# Altium footprint library ICs And Semiconductors THD.PcbLib: 507 footprints (part 16 of 32)
Each footprint in its own frame and in the unit in brackets; x right, y up, seen from the top. Pads: shape width x height; smd on the part's side, far side on the other; paste and mask are expansions set on the pad; w line width, h text height; cw(c..) or ccw(c..) is an arc to the next point about the centre after c.
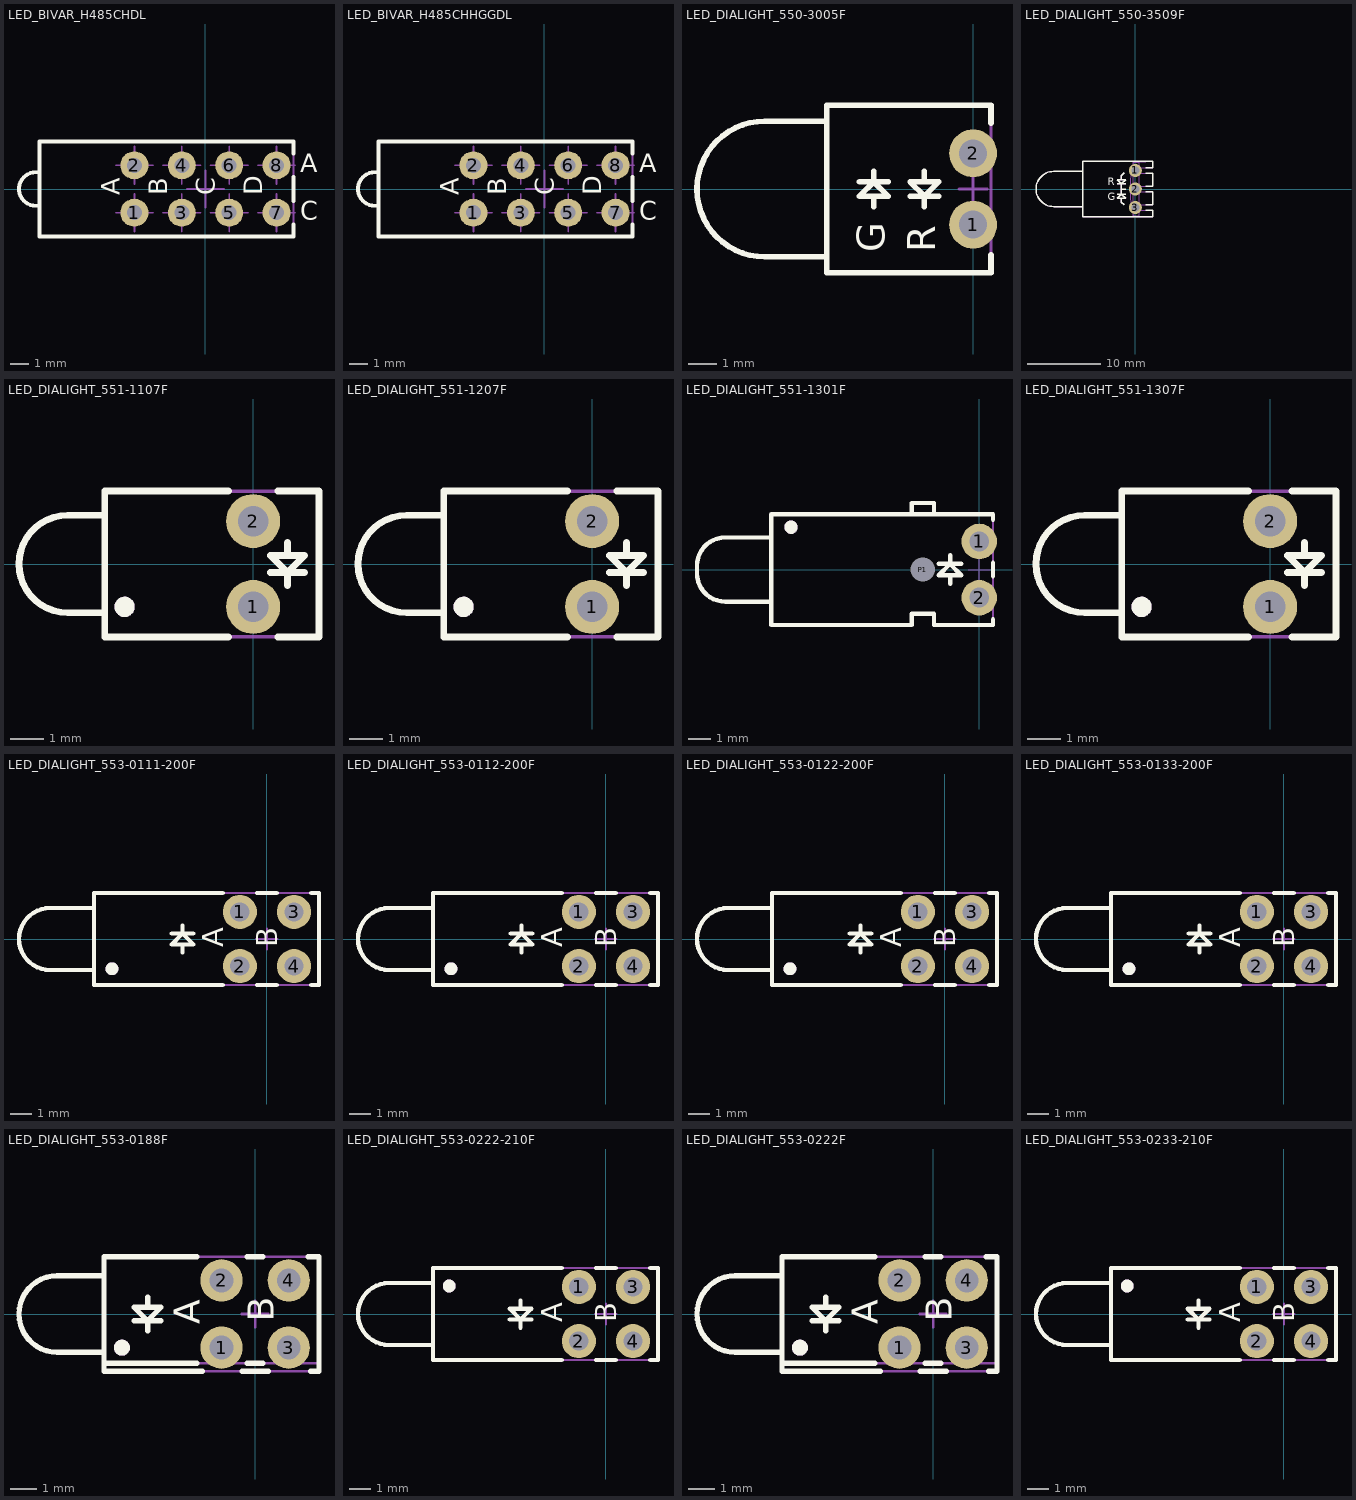
[diagram p15: the footprints below, top view; thin cyan lines are the x and y axes]

## LED_BIVAR_H485CHDL [mm] "Quad-Level 2mm HE Red, PCB Edge Mounting  BIVAR H485CHDL"
height 11.3
pads (8):
  round 1.5 hole 0.8: 1(-3.81,-1.27) 2(-3.81,1.27) 3(-1.27,-1.27) 4(-1.27,1.27) 5(1.27,-1.27) 6(1.27,1.27) 7(3.81,-1.27) 8(3.81,1.27)
Top Overlay:
  lines w0.2: -8.89,-0.9 -9.09,-0.9 cw(c-9.09,0) -9.09,0.9 -8.89,0.9 ; 4.71,-1.902 4.71,-2.55 -8.89,-2.55 -8.89,2.55 4.71,2.55 4.71,1.902 ; 4.71,-0.638 4.71,0.638
  text "A" at -4.591,-0.331 h1
  text "B" at -2.051,-0.331 h1
  text "C" at 0.489,-0.331 h1
  text "D" at 3.029,-0.331 h1
  text "A" at 5.08,0.889 h1
  text "C" at 5.08,-1.651 h1
Notvisible:
  lines w0.1: -4.81,-1.27 -3.81,-1.27 ; -4.81,1.27 -3.81,1.27 ; -3.81,-2.27 -3.81,-1.27 ; -3.81,-0.27 -3.81,-1.27 ; -3.81,0.27 -3.81,1.27 ; -3.81,2.27 -3.81,1.27 ; -2.81,-1.27 -3.81,-1.27 ; -2.81,1.27 -3.81,1.27 ; -2.27,-1.27 -1.27,-1.27 ; -2.27,1.27 -1.27,1.27 ; -1.27,-2.27 -1.27,-1.27 ; -1.27,-0.27 -1.27,-1.27 ; -1.27,0.27 -1.27,1.27 ; -1.27,2.27 -1.27,1.27 ; -1,0 0,0 ; -0.27,-1.27 -1.27,-1.27 ; -0.27,1.27 -1.27,1.27 ; 0,-1 0,0 ; 0,1 0,0 ; 0.27,-1.27 1.27,-1.27 ; 0.27,1.27 1.27,1.27 ; 1,0 0,0 ; 1.27,-2.27 1.27,-1.27 ; 1.27,-0.27 1.27,-1.27 ; 1.27,0.27 1.27,1.27 ; 1.27,2.27 1.27,1.27 ; 2.27,-1.27 1.27,-1.27 ; 2.27,1.27 1.27,1.27 ; 2.81,-1.27 3.81,-1.27 ; 2.81,1.27 3.81,1.27 ; 3.81,-2.27 3.81,-1.27 ; 3.81,-0.27 3.81,-1.27 ; 3.81,0.27 3.81,1.27 ; 3.81,2.27 3.81,1.27 ; 4.81,-1.27 3.81,-1.27 ; 4.81,1.27 3.81,1.27
Mechanical 14:
  lines w0.1: -8.89,-0.9 -9.09,-0.9 cw(c-9.09,0) -9.09,0.9 -8.89,0.9 ; -8.89,-2.55 -8.89,2.55 4.71,2.55 4.71,-2.55 -8.89,-2.55
  text "A" at -4.591,-0.331 h1
  text "B" at -2.051,-0.331 h1
  text "C" at 0.489,-0.331 h1
  text "D" at 3.029,-0.331 h1
  text "C" at 5.08,-1.651 h1
  text "A" at 5.08,0.889 h1
3D body "LED_BIVAR_H485CHDL.stp": height 11.3, standoff -3.2, extent -9.99,-2.55 4.71,2.55

## LED_BIVAR_H485CHHGGDL [mm] "Quad-Level 2mm (Green+Green+HeRed+HeRed) LED, PCB Edge Mounting BIVAR H485C Serie"
height 11.3
pads (8):
  round 1.5 hole 0.8: 1(-3.81,-1.27) 2(-3.81,1.27) 3(-1.27,-1.27) 4(-1.27,1.27) 5(1.27,-1.27) 6(1.27,1.27) 7(3.81,-1.27) 8(3.81,1.27)
Top Overlay:
  lines w0.2: -8.89,-0.9 -9.09,-0.9 cw(c-9.09,0) -9.09,0.9 -8.89,0.9 ; 4.71,-1.902 4.71,-2.55 -8.89,-2.55 -8.89,2.55 4.71,2.55 4.71,1.902 ; 4.71,-0.638 4.71,0.638
  text "C" at 5.08,-1.651 h1
  text "A" at 5.08,0.889 h1
  text "D" at 3.029,-0.331 h1
  text "C" at 0.489,-0.331 h1
  text "B" at -2.051,-0.331 h1
  text "A" at -4.591,-0.331 h1
Notvisible:
  lines w0.1: -4.81,-1.27 -3.81,-1.27 ; -4.81,1.27 -3.81,1.27 ; -3.81,-2.27 -3.81,-1.27 ; -3.81,-0.27 -3.81,-1.27 ; -3.81,0.27 -3.81,1.27 ; -3.81,2.27 -3.81,1.27 ; -2.81,-1.27 -3.81,-1.27 ; -2.81,1.27 -3.81,1.27 ; -2.27,-1.27 -1.27,-1.27 ; -2.27,1.27 -1.27,1.27 ; -1.27,-2.27 -1.27,-1.27 ; -1.27,-0.27 -1.27,-1.27 ; -1.27,0.27 -1.27,1.27 ; -1.27,2.27 -1.27,1.27 ; -1,0 0,0 ; -0.27,-1.27 -1.27,-1.27 ; -0.27,1.27 -1.27,1.27 ; 0,-1 0,0 ; 0,1 0,0 ; 0.27,-1.27 1.27,-1.27 ; 0.27,1.27 1.27,1.27 ; 1,0 0,0 ; 1.27,-2.27 1.27,-1.27 ; 1.27,-0.27 1.27,-1.27 ; 1.27,0.27 1.27,1.27 ; 1.27,2.27 1.27,1.27 ; 2.27,-1.27 1.27,-1.27 ; 2.27,1.27 1.27,1.27 ; 2.81,-1.27 3.81,-1.27 ; 2.81,1.27 3.81,1.27 ; 3.81,-2.27 3.81,-1.27 ; 3.81,-0.27 3.81,-1.27 ; 3.81,0.27 3.81,1.27 ; 3.81,2.27 3.81,1.27 ; 4.81,-1.27 3.81,-1.27 ; 4.81,1.27 3.81,1.27
Mechanical 14:
  lines w0.1: -8.89,-0.9 -9.09,-0.9 cw(c-9.09,0) -9.09,0.9 -8.89,0.9 ; -8.89,-2.55 4.71,-2.55 4.71,2.55 -8.89,2.55 -8.89,-2.55
  text "A" at 5.08,0.889 h1
  text "C" at 5.08,-1.651 h1
  text "D" at 3.029,-0.331 h1
  text "C" at 0.489,-0.331 h1
  text "B" at -2.051,-0.331 h1
  text "A" at -4.591,-0.331 h1
3D body "LED_BIVAR_H485CHHGGDL.stp": height 11.3, standoff -3.2, extent -9.99,-2.55 4.71,2.55

## LED_DIALIGHT_550-3005F [mm] "Single 5mm Bi-color Red/Green LED, Body 5.84x6.1mm (Square Back Housing), Leads Spacing 2.54mm"
height 6.1
pads (2):
  round 1.7 hole 1: 1(0,-1.27) 2(0,1.27)
Top Overlay:
  lines w0.2: -5.207,-2.415 -7.411,-2.415 cw(c-7.411,0) -7.411,2.415 -5.207,2.415 ; -4.042,0.254 -3.026,0.254 ; -3.534,-0.635 -3.534,-0.254 ; -3.534,0.635 -3.534,0.254 ; -2.242,-0.254 -1.226,-0.254 ; -1.734,-0.635 -1.734,-0.254 ; -1.734,0.254 -1.734,0.635 ; 0.635,-2.347 0.635,-2.985 -5.207,-2.985 -5.207,2.985 0.635,2.985 0.635,2.347 ; -3.534,0.254 -3.026,-0.254 -4.042,-0.254 -3.534,0.254 ; -1.734,-0.254 -1.226,0.254 -2.242,0.254 -1.734,-0.254
  text "R" at -1.351,-2.256 h1
  text "G" at -3.151,-2.256 h1
Notvisible:
  lines w0.1: -0.5,-1.27 0,-1.27 ; -0.5,0 0,0 ; -0.5,1.27 0,1.27 ; 0,-1.77 0,-1.27 ; 0,-0.77 0,-1.27 ; 0,-0.5 0,0 ; 0,0.5 0,0 ; 0,0.77 0,1.27 ; 0,1.77 0,1.27 ; 0.5,-1.27 0,-1.27 ; 0.5,0 0,0 ; 0.5,1.27 0,1.27
Mechanical 14:
  lines w0.1: -5.207,-2.415 -7.411,-2.415 cw(c-7.411,0) -7.411,2.415 -5.207,2.415 ; -3.534,-0.635 -3.534,-0.254 ; -3.534,0.635 -3.534,0.254 ; -1.734,-0.635 -1.734,-0.254 ; -1.734,0.254 -1.734,0.635 ; -4.042,-0.254 -3.534,0.254 ; -4.042,-0.254 -3.026,-0.254 ; -4.042,-0.254 -3.026,-0.254 ; -4.042,-0.254 -3.534,0.254 ; -4.042,-0.254 -3.534,0.254 ; -4.042,-0.254 -3.026,-0.254 ; -4.042,0.254 -3.026,0.254 ; -4.042,0.254 -3.026,0.254 ; -4.042,0.254 -3.026,0.254 ; -3.534,0.254 -3.026,-0.254 ; -3.534,0.254 -3.026,-0.254 ; -3.534,0.254 -3.026,-0.254 ; -2.242,-0.254 -1.226,-0.254 ; -2.242,-0.254 -1.226,-0.254 ; -2.242,-0.254 -1.226,-0.254 ; -2.242,0.254 -1.226,0.254 ; -2.242,0.254 -1.734,-0.254 ; -2.242,0.254 -1.734,-0.254 ; -2.242,0.254 -1.226,0.254 ; -2.242,0.254 -1.226,0.254 ; -2.242,0.254 -1.734,-0.254 ; -1.734,-0.254 -1.226,0.254 ; -1.734,-0.254 -1.226,0.254 ; -1.734,-0.254 -1.226,0.254 ; -5.207,-2.985 0.635,-2.985 0.635,-1.714 0.44,-1.714 0.44,-0.826 0.635,-0.826 0.635,0.826 0.44,0.826 0.44,1.714 0.635,1.714 0.635,2.985 -5.207,2.985 -5.207,-2.985
  text "R" at -1.351,-2.256 h1
  text "G" at -3.151,-2.256 h1
3D body "LED_DIALIGHT_550-3005F.stp": height 5.97, standoff -3.67, extent -9.826,-2.984 0.635,2.985

## LED_DIALIGHT_550-3509F [mm] "Bicolor Red/Green  LED, 3-Leads, Body 9.65x7.62mm, Leads Spacing 2.54mm"
height 7.62
pads (3):
  round 1.8 hole 1.1: 1(0,2.54) 2(0,0) 3(0,-2.54)
Top Overlay:
  lines w0.2: -7.24,-2.415 -11.225,-2.415 cw(c-11.225,0) -11.225,2.415 -7.24,2.415 ; -2.505,-0.7 -1.305,-0.7 ; -2.505,0.7 -1.305,0.7 ; -1.905,-1.3 -1.905,-1.8 -1.555,-2.15 ; -1.905,0 -1.305,0 ; -1.905,1.3 -1.905,1.8 -1.505,2.2 ; 1.41,-2.921 2.41,-2.921 2.41,-3.81 -7.24,-3.81 -7.24,3.81 2.41,3.81 2.41,2.921 1.41,2.921 ; 1.41,-2.159 2.41,-2.159 2.41,-0.381 1.41,-0.381 ; 1.41,0.381 2.41,0.381 2.41,2.159 1.41,2.159 ; -1.905,-0.7 -1.305,-1.3 -2.505,-1.3 -1.905,-0.7 ; -1.905,-0.7 -1.905,0.7 ; -1.905,0.7 -2.505,1.3 -1.305,1.3 -1.905,0.7
  text "R" at -3.81,0.508 h1
  text "G" at -3.81,-1.524 h1
Notvisible:
  circle w0.1: c0,-2.54 r0.55
  circle w0.1: c0,0 r0.55
  circle w0.1: c0,2.54 r0.55
  lines w0.1: -0.5,-2.54 0,-2.54 ; -0.5,0 0,0 ; -0.5,2.54 0,2.54 ; 0,-3.04 0,-2.54 ; 0,-2.04 0,-2.54 ; 0,-0.5 0,0 ; 0,0.5 0,0 ; 0,2.04 0,2.54 ; 0,3.04 0,2.54 ; 0.5,-2.54 0,-2.54 ; 0.5,0 0,0 ; 0.5,2.54 0,2.54
Mechanical 14:
  lines w0.1: -7.24,-2.415 -11.225,-2.415 cw(c-11.225,0) -11.225,2.415 -7.24,2.415 ; -2.505,-0.7 -1.305,-0.7 ; -2.505,0.7 -1.305,0.7 ; -1.905,-1.8 -1.905,-1.3 ; -1.905,0 -1.305,0 ; -1.905,1.3 -1.905,1.8 ; -0.255,-2.921 2.41,-2.921 2.41,-3.81 ; -0.255,-0.381 2.41,-0.381 2.41,-2.159 -0.255,-2.159 -0.254,-2.286 0.254,-2.286 0.254,-2.794 -0.254,-2.794 ; -0.255,2.159 2.41,2.159 2.41,0.381 -0.255,0.381 -0.254,0.254 0.254,0.254 0.254,-0.254 -0.254,-0.254 ; -0.254,2.159 -0.254,2.286 0.254,2.286 0.254,2.794 -0.254,2.794 -0.255,2.921 2.41,2.921 2.41,3.81 ; 0.507,-2.921 0.507,-3.672 ; 0.507,-2.159 0.507,-0.381 ; 0.507,0.381 0.507,2.159 ; 0.507,2.921 0.507,3.672 ; -1.905,-0.7 -1.905,0.7 ; -1.905,-0.7 -2.505,-1.3 -1.305,-1.3 -1.905,-0.7 ; -1.905,0.7 -1.305,1.3 -2.505,1.3 -1.905,0.7 ; -0.255,-3.672 cw(c13.403,0) -0.255,3.672 ; -0.255,-3.672 -0.255,3.672 ; -0.255,-3.672 0.507,-3.672 ; -0.255,3.672 0.507,3.672 ; 0.507,-3.672 2.41,-3.81 ; 0.507,3.672 2.41,3.81 ; 2.41,-3.81 -7.24,-3.81 -7.24,3.81 2.41,3.81
  text "R" at -3.81,0.508 h1
  text "G" at -3.81,-1.524 h1
3D body "LED_DIALIGHT_550-3509F.stp": height 7.62, standoff -3.1, extent -13.64,-3.81 2.41,3.81

## LED_DIALIGHT_551-1107F [mm] "Single 3mm Red LED, Body 6.35x4.32mm, Pin spacing 2.54mm"
height 7.11
pads (2):
  round 1.6 hole 0.9: 1(0,-1.27) 2(0,1.27)
Top Overlay:
  circle w0.3: c-3.81,-1.27 r0.15
  lines w0.2: -4.4,-1.445 -5.495,-1.445 cw(c-5.495,0) -5.495,1.445 -4.4,1.445 ; -0.728,-2.16 -4.4,-2.16 -4.4,2.16 -0.728,2.16 ; 0.508,-0.254 1.524,-0.254 ; 0.728,-2.16 1.95,-2.16 1.95,2.16 0.728,2.16 ; 1.016,-0.635 1.016,-0.254 ; 1.016,0.254 1.016,0.635 ; 1.016,-0.254 1.524,0.254 0.508,0.254 1.016,-0.254
Notvisible:
  lines w0.1: -0.5,-1.27 0,-1.27 ; -0.5,1.27 0,1.27 ; 0,-1.77 0,-1.27 ; 0,-0.77 0,-1.27 ; 0,0.77 0,1.27 ; 0,1.77 0,1.27 ; 0.5,-1.27 0,-1.27 ; 0.5,1.27 0,1.27
Mechanical 14:
  circle w0.3: c-3.81,-1.27 r0.15
  lines w0.1: -4.4,-1.445 -5.495,-1.445 cw(c-5.495,0) -5.495,1.445 -4.4,1.445 ; 1.016,-0.635 1.016,-0.254 ; 1.016,0.254 1.016,0.635 ; 0.508,-0.254 1.524,-0.254 ; 0.508,-0.254 1.524,-0.254 ; 0.508,-0.254 1.524,-0.254 ; 0.508,0.254 1.524,0.254 ; 0.508,0.254 1.016,-0.254 ; 0.508,0.254 1.016,-0.254 ; 0.508,0.254 1.524,0.254 ; 0.508,0.254 1.524,0.254 ; 0.508,0.254 1.016,-0.254 ; 1.016,-0.254 1.524,0.254 ; 1.016,-0.254 1.524,0.254 ; 1.016,-0.254 1.524,0.254 ; -4.4,-2.16 1.95,-2.16 1.95,2.16 -4.4,2.16 -4.4,-2.16
3D body "LED_DIALIGHT_551-1107F.stp": height 7.11, standoff -3.68, extent -6.94,-2.16 1.95,2.16

## LED_DIALIGHT_551-1207F [mm] "Single 3mm Yellow LED, Body 6.35x4.32mm, Pin spacing 2.54mm"
height 7.11
pads (2):
  round 1.6 hole 0.9: 1(0,-1.27) 2(0,1.27)
Top Overlay:
  circle w0.3: c-3.81,-1.27 r0.15
  lines w0.2: -4.4,-1.445 -5.495,-1.445 cw(c-5.495,0) -5.495,1.445 -4.4,1.445 ; -0.728,-2.16 -4.4,-2.16 -4.4,2.16 -0.728,2.16 ; 0.508,-0.254 1.524,-0.254 ; 0.728,-2.16 1.95,-2.16 1.95,2.16 0.728,2.16 ; 1.016,-0.635 1.016,-0.254 ; 1.016,0.254 1.016,0.635 ; 1.016,-0.254 0.508,0.254 1.524,0.254 1.016,-0.254
Notvisible:
  lines w0.1: -0.5,-1.27 0,-1.27 ; -0.5,1.27 0,1.27 ; 0,-1.77 0,-1.27 ; 0,-0.77 0,-1.27 ; 0,0.77 0,1.27 ; 0,1.77 0,1.27 ; 0.5,-1.27 0,-1.27 ; 0.5,1.27 0,1.27
Mechanical 14:
  circle w0.3: c-3.81,-1.27 r0.15
  lines w0.1: -4.4,-1.445 -5.495,-1.445 cw(c-5.495,0) -5.495,1.445 -4.4,1.445 ; 1.016,-0.635 1.016,-0.254 ; 1.016,0.254 1.016,0.635 ; 0.508,-0.254 1.524,-0.254 ; 0.508,-0.254 1.524,-0.254 ; 0.508,-0.254 1.524,-0.254 ; 0.508,0.254 1.016,-0.254 ; 0.508,0.254 1.524,0.254 ; 0.508,0.254 1.524,0.254 ; 0.508,0.254 1.016,-0.254 ; 0.508,0.254 1.016,-0.254 ; 0.508,0.254 1.524,0.254 ; 1.016,-0.254 1.524,0.254 ; 1.016,-0.254 1.524,0.254 ; 1.016,-0.254 1.524,0.254 ; -4.4,-2.16 -4.4,2.16 1.95,2.16 1.95,-2.16 -4.4,-2.16
3D body "LED_DIALIGHT_551-1207F.stp": height 7.11, standoff -3.68, extent -6.94,-2.16 1.95,2.16

## LED_DIALIGHT_551-1301F [mm] "Single 3mm Green LED, Body 10x5mm, Pin spacing 2.54mm"
height 10
pads (3):
  round 1.6 hole 0.9: 1(0,1.27) 2(0,-1.27)
  round 0.5 hole 1.1 unplated mask+0.3: P1(-2.54,0)
Top Overlay:
  circle w0.3: c-8.49,1.91 r0.15
  lines w0.2: -9.38,-1.445 -11.46,-1.445 cw(c-11.46,-0.175) -12.73,-0.175 -12.73,0.175 cw(c-11.46,0.175) -11.46,1.445 -9.38,1.445 ; -3.04,2.5 -3.04,3 -2.04,3 -2.04,2.5 ; -1.824,0.254 -0.808,0.254 ; -1.316,-0.635 -1.316,-0.254 ; -1.316,0.635 -1.316,0.254 ; 0.62,-2.239 0.62,-2.5 -2.04,-2.5 -2.04,-2 -3.04,-2 -3.04,-2.5 -9.38,-2.5 -9.38,2.5 0.62,2.5 0.62,2.239 ; 0.62,-0.301 0.62,0.301 ; -1.316,0.254 -0.808,-0.254 -1.824,-0.254 -1.316,0.254
Notvisible:
  lines w0.05: -3.04,0 -2.54,0 ; -2.54,-0.5 -2.54,0 ; -2.54,0.5 -2.54,0 ; -2.04,0 -2.54,0 ; -0.5,-1.27 0,-1.27 ; -0.5,0 0,0 ; -0.5,1.27 0,1.27 ; 0,-1.77 0,-1.27 ; 0,-0.77 0,-1.27 ; 0,-0.5 0,0 ; 0,0.5 0,0 ; 0,0.77 0,1.27 ; 0,1.77 0,1.27 ; 0.5,-1.27 0,-1.27 ; 0.5,0 0,0 ; 0.5,1.27 0,1.27
Mechanical 14:
  circle w0.3: c-8.49,1.91 r0.15
  lines w0.1: -9.38,-1.445 -11.46,-1.445 cw(c-11.46,-0.175) -12.73,-0.175 -12.73,0.175 cw(c-11.46,0.175) -11.46,1.445 -9.38,1.445 ; -3.04,2.5 -3.04,3 -2.04,3 -2.04,2.5 ; -1.316,-0.635 -1.316,-0.254 ; -1.316,0.635 -1.316,0.254 ; -1.824,-0.254 -1.316,0.254 ; -1.824,-0.254 -0.808,-0.254 ; -1.824,-0.254 -0.808,-0.254 ; -1.824,-0.254 -1.316,0.254 ; -1.824,-0.254 -1.316,0.254 ; -1.824,-0.254 -0.808,-0.254 ; -1.824,0.254 -0.808,0.254 ; -1.824,0.254 -0.808,0.254 ; -1.824,0.254 -0.808,0.254 ; -1.316,0.254 -0.808,-0.254 ; -1.316,0.254 -0.808,-0.254 ; -1.316,0.254 -0.808,-0.254 ; -9.38,-2.5 -3.04,-2.5 -3.04,-2 -2.04,-2 -2.04,-2.5 0.62,-2.5 0.62,2.5 -9.38,2.5 -9.38,-2.5
3D body "LED_DIALIGHT_551-1301F.stp": height 10, standoff -3.68, extent -12.73,-2.5 0.62,3

## LED_DIALIGHT_551-1307F [mm] "Single 3mm Green LED, Body 6.35x4.32mm, Pin spacing 2.54mm"
height 7.11
pads (2):
  round 1.6 hole 0.9: 1(0,-1.27) 2(0,1.27)
Top Overlay:
  circle w0.3: c-3.81,-1.27 r0.15
  lines w0.2: -4.4,-1.445 -5.495,-1.445 cw(c-5.495,0) -5.495,1.445 -4.4,1.445 ; -0.646,-2.16 -4.4,-2.16 -4.4,2.16 -0.646,2.16 ; 0.508,-0.254 1.524,-0.254 ; 0.646,-2.16 1.95,-2.16 1.95,2.16 0.646,2.16 ; 1.016,-0.635 1.016,-0.254 ; 1.016,0.254 1.016,0.635 ; 1.016,-0.254 1.524,0.254 0.508,0.254 1.016,-0.254
Notvisible:
  lines w0.1: -0.5,-1.27 0,-1.27 ; -0.5,1.27 0,1.27 ; 0,-1.77 0,-1.27 ; 0,-0.77 0,-1.27 ; 0,0.77 0,1.27 ; 0,1.77 0,1.27 ; 0.5,-1.27 0,-1.27 ; 0.5,1.27 0,1.27
Mechanical 14:
  circle w0.3: c-3.81,-1.27 r0.15
  lines w0.1: -4.4,-1.445 -5.495,-1.445 cw(c-5.495,0) -5.495,1.445 -4.4,1.445 ; 1.016,-0.635 1.016,-0.254 ; 1.016,0.254 1.016,0.635 ; 0.508,-0.254 1.524,-0.254 ; 0.508,-0.254 1.524,-0.254 ; 0.508,-0.254 1.524,-0.254 ; 0.508,0.254 1.524,0.254 ; 0.508,0.254 1.016,-0.254 ; 0.508,0.254 1.016,-0.254 ; 0.508,0.254 1.524,0.254 ; 0.508,0.254 1.524,0.254 ; 0.508,0.254 1.016,-0.254 ; 1.016,-0.254 1.524,0.254 ; 1.016,-0.254 1.524,0.254 ; 1.016,-0.254 1.524,0.254 ; -4.4,-2.16 1.95,-2.16 1.95,2.16 -4.4,2.16 -4.4,-2.16
3D body "LED_DIALIGHT_551-1307F.stp": height 7.11, standoff -3.68, extent -6.94,-2.16 1.95,2.16

## LED_DIALIGHT_553-0111-200F [mm] "Dual 3mm Red LED, Body 10.55x4.32mm, Pin spacing 2.54mm"
height 9.65
pads (4):
  round 1.6 hole 0.9: 1(-1.27,1.27) 2(-1.27,-1.27) 3(1.27,1.27) 4(1.27,-1.27)
Top Overlay:
  circle w0.3: c-7.262,-1.397 r0.15
  lines w0.2: -8.11,-1.45 -10.17,-1.45 cw(c-10.17,0) -10.17,1.45 -8.11,1.45 ; -4.464,0.254 -3.448,0.254 ; -3.956,-0.635 -3.956,-0.254 ; -3.956,0.635 -3.956,0.254 ; -2.075,-2.16 -8.11,-2.16 -8.11,2.16 -2.075,2.16 ; -0.465,-2.16 0.465,-2.16 ; -0.465,2.16 0.465,2.16 ; 2.075,-2.16 2.44,-2.16 2.44,2.16 2.075,2.16 ; -3.956,0.254 -3.448,-0.254 -4.464,-0.254 -3.956,0.254
  text "B" at 0.489,-0.381 h1
  text "A" at -2.051,-0.381 h1
Notvisible:
  lines w0.1: -1.77,-1.27 -1.27,-1.27 ; -1.77,1.27 -1.27,1.27 ; -1.27,-1.77 -1.27,-1.27 ; -1.27,-0.77 -1.27,-1.27 ; -1.27,0.77 -1.27,1.27 ; -1.27,1.77 -1.27,1.27 ; -0.77,-1.27 -1.27,-1.27 ; -0.77,1.27 -1.27,1.27 ; -0.5,0 0,0 ; 0,-0.5 0,0 ; 0,0.5 0,0 ; 0.5,0 0,0 ; 0.77,-1.27 1.27,-1.27 ; 0.77,1.27 1.27,1.27 ; 1.27,-1.77 1.27,-1.27 ; 1.27,-0.77 1.27,-1.27 ; 1.27,0.77 1.27,1.27 ; 1.27,1.77 1.27,1.27 ; 1.77,-1.27 1.27,-1.27 ; 1.77,1.27 1.27,1.27
Mechanical 14:
  circle w0.3: c-7.262,-1.397 r0.15
  lines w0.1: -8.11,-1.45 -10.17,-1.45 cw(c-10.17,0) -10.17,1.45 -8.11,1.45 ; -3.956,-0.635 -3.956,-0.254 ; -3.956,0.635 -3.956,0.254 ; -4.464,-0.254 -3.956,0.254 ; -4.464,-0.254 -3.448,-0.254 ; -4.464,-0.254 -3.448,-0.254 ; -4.464,-0.254 -3.956,0.254 ; -4.464,-0.254 -3.956,0.254 ; -4.464,-0.254 -3.448,-0.254 ; -4.464,0.254 -3.448,0.254 ; -4.464,0.254 -3.448,0.254 ; -4.464,0.254 -3.448,0.254 ; -3.956,0.254 -3.448,-0.254 ; -3.956,0.254 -3.448,-0.254 ; -3.956,0.254 -3.448,-0.254 ; -8.11,-2.16 -8.11,2.16 2.44,2.16 2.44,-2.16 -8.11,-2.16
  text "B" at 0.489,-0.381 h1
  text "A" at -2.051,-0.381 h1
3D body "LED_DIALIGHT_553-0111-200F.stp": height 9.65, standoff -3.68, extent -11.62,-2.16 2.44,2.16

## LED_DIALIGHT_553-0112-200F [mm] "Dual 3mm LED  (Top: Red, Bot: Green), Body 10.55x4.32mm, Pin spacing 2.54mm"
height 9.65
pads (4):
  round 1.6 hole 0.9: 1(-1.27,1.27) 2(-1.27,-1.27) 3(1.27,1.27) 4(1.27,-1.27)
Top Overlay:
  circle w0.3: c-7.262,-1.397 r0.15
  lines w0.2: -8.11,-1.45 -10.17,-1.45 cw(c-10.17,0) -10.17,1.45 -8.11,1.45 ; -4.464,0.254 -3.448,0.254 ; -3.956,-0.635 -3.956,-0.254 ; -3.956,0.635 -3.956,0.254 ; -2.075,-2.16 -8.11,-2.16 -8.11,2.16 -2.075,2.16 ; -0.465,-2.16 0.465,-2.16 ; -0.465,2.16 0.465,2.16 ; 2.075,-2.16 2.44,-2.16 2.44,2.16 2.075,2.16 ; -3.956,0.254 -4.464,-0.254 -3.448,-0.254 -3.956,0.254
  text "A" at -2.051,-0.381 h1
  text "B" at 0.489,-0.381 h1
Notvisible:
  lines w0.1: -1.77,-1.27 -1.27,-1.27 ; -1.77,1.27 -1.27,1.27 ; -1.27,-1.77 -1.27,-1.27 ; -1.27,-0.77 -1.27,-1.27 ; -1.27,0.77 -1.27,1.27 ; -1.27,1.77 -1.27,1.27 ; -0.77,-1.27 -1.27,-1.27 ; -0.77,1.27 -1.27,1.27 ; -0.5,0 0,0 ; 0,-0.5 0,0 ; 0,0.5 0,0 ; 0.5,0 0,0 ; 0.77,-1.27 1.27,-1.27 ; 0.77,1.27 1.27,1.27 ; 1.27,-1.77 1.27,-1.27 ; 1.27,-0.77 1.27,-1.27 ; 1.27,0.77 1.27,1.27 ; 1.27,1.77 1.27,1.27 ; 1.77,-1.27 1.27,-1.27 ; 1.77,1.27 1.27,1.27
Mechanical 14:
  circle w0.3: c-7.262,-1.397 r0.15
  lines w0.1: -8.11,-1.45 -10.17,-1.45 cw(c-10.17,0) -10.17,1.45 -8.11,1.45 ; -3.956,-0.635 -3.956,-0.254 ; -3.956,0.635 -3.956,0.254 ; -4.464,-0.254 -3.448,-0.254 ; -4.464,-0.254 -3.956,0.254 ; -4.464,-0.254 -3.956,0.254 ; -4.464,-0.254 -3.448,-0.254 ; -4.464,-0.254 -3.448,-0.254 ; -4.464,-0.254 -3.956,0.254 ; -4.464,0.254 -3.448,0.254 ; -4.464,0.254 -3.448,0.254 ; -4.464,0.254 -3.448,0.254 ; -3.956,0.254 -3.448,-0.254 ; -3.956,0.254 -3.448,-0.254 ; -3.956,0.254 -3.448,-0.254 ; -8.11,-2.16 -8.11,2.16 2.44,2.16 2.44,-2.16 -8.11,-2.16
  text "A" at -2.051,-0.381 h1
  text "B" at 0.489,-0.381 h1
3D body "LED_DIALIGHT_553-0112-200F.stp": height 9.65, standoff -3.68, extent -11.62,-2.16 2.44,2.16

## LED_DIALIGHT_553-0122-200F [mm] "Dual 3mm Green LED, Body 10.55x4.32mm, Pin spacing 2.54mm"
height 9.65
pads (4):
  round 1.6 hole 0.9: 1(-1.27,1.27) 2(-1.27,-1.27) 3(1.27,1.27) 4(1.27,-1.27)
Top Overlay:
  circle w0.3: c-7.262,-1.397 r0.15
  lines w0.2: -8.11,-1.45 -10.17,-1.45 cw(c-10.17,0) -10.17,1.45 -8.11,1.45 ; -4.464,0.254 -3.448,0.254 ; -3.956,-0.635 -3.956,-0.254 ; -3.956,0.635 -3.956,0.254 ; -2.075,-2.16 -8.11,-2.16 -8.11,2.16 -2.075,2.16 ; -0.465,-2.16 0.465,-2.16 ; -0.465,2.16 0.465,2.16 ; 2.075,-2.16 2.44,-2.16 2.44,2.16 2.075,2.16 ; -3.956,0.254 -3.448,-0.254 -4.464,-0.254 -3.956,0.254
  text "B" at 0.489,-0.381 h1
  text "A" at -2.051,-0.381 h1
Notvisible:
  lines w0.1: -1.77,-1.27 -1.27,-1.27 ; -1.77,1.27 -1.27,1.27 ; -1.27,-1.77 -1.27,-1.27 ; -1.27,-0.77 -1.27,-1.27 ; -1.27,0.77 -1.27,1.27 ; -1.27,1.77 -1.27,1.27 ; -0.77,-1.27 -1.27,-1.27 ; -0.77,1.27 -1.27,1.27 ; -0.5,0 0,0 ; 0,-0.5 0,0 ; 0,0.5 0,0 ; 0.5,0 0,0 ; 0.77,-1.27 1.27,-1.27 ; 0.77,1.27 1.27,1.27 ; 1.27,-1.77 1.27,-1.27 ; 1.27,-0.77 1.27,-1.27 ; 1.27,0.77 1.27,1.27 ; 1.27,1.77 1.27,1.27 ; 1.77,-1.27 1.27,-1.27 ; 1.77,1.27 1.27,1.27
Mechanical 14:
  circle w0.3: c-7.262,-1.397 r0.15
  lines w0.1: -8.11,-1.45 -10.17,-1.45 cw(c-10.17,0) -10.17,1.45 -8.11,1.45 ; -3.956,-0.635 -3.956,-0.254 ; -3.956,0.635 -3.956,0.254 ; -4.464,-0.254 -3.956,0.254 ; -4.464,-0.254 -3.448,-0.254 ; -4.464,-0.254 -3.448,-0.254 ; -4.464,-0.254 -3.956,0.254 ; -4.464,-0.254 -3.956,0.254 ; -4.464,-0.254 -3.448,-0.254 ; -4.464,0.254 -3.448,0.254 ; -4.464,0.254 -3.448,0.254 ; -4.464,0.254 -3.448,0.254 ; -3.956,0.254 -3.448,-0.254 ; -3.956,0.254 -3.448,-0.254 ; -3.956,0.254 -3.448,-0.254 ; -8.11,-2.16 2.44,-2.16 2.44,2.16 -8.11,2.16 -8.11,-2.16
  text "B" at 0.489,-0.381 h1
  text "A" at -2.051,-0.381 h1
3D body "LED_DIALIGHT_553-0122-200F.stp": height 9.65, standoff -3.68, extent -11.62,-2.16 2.44,2.16

## LED_DIALIGHT_553-0133-200F [mm] "Dual 3mm Yellow LED, Body 10.55x4.32mm, Pin spacing 2.54mm"
height 9.65
pads (4):
  round 1.6 hole 0.9: 1(-1.27,1.27) 2(-1.27,-1.27) 3(1.27,1.27) 4(1.27,-1.27)
Top Overlay:
  circle w0.3: c-7.262,-1.397 r0.15
  lines w0.2: -8.11,-1.45 -10.17,-1.45 cw(c-10.17,0) -10.17,1.45 -8.11,1.45 ; -4.464,0.254 -3.448,0.254 ; -3.956,-0.635 -3.956,-0.254 ; -3.956,0.635 -3.956,0.254 ; -2.075,-2.16 -8.11,-2.16 -8.11,2.16 -2.075,2.16 ; -0.465,-2.16 0.465,-2.16 ; -0.465,2.16 0.465,2.16 ; 2.075,-2.16 2.44,-2.16 2.44,2.16 2.075,2.16 ; -3.956,0.254 -4.464,-0.254 -3.448,-0.254 -3.956,0.254
  text "A" at -2.051,-0.381 h1
  text "B" at 0.489,-0.381 h1
Notvisible:
  lines w0.1: -1.77,-1.27 -1.27,-1.27 ; -1.77,1.27 -1.27,1.27 ; -1.27,-1.77 -1.27,-1.27 ; -1.27,-0.77 -1.27,-1.27 ; -1.27,0.77 -1.27,1.27 ; -1.27,1.77 -1.27,1.27 ; -0.77,-1.27 -1.27,-1.27 ; -0.77,1.27 -1.27,1.27 ; -0.5,0 0,0 ; 0,-0.5 0,0 ; 0,0.5 0,0 ; 0.5,0 0,0 ; 0.77,-1.27 1.27,-1.27 ; 0.77,1.27 1.27,1.27 ; 1.27,-1.77 1.27,-1.27 ; 1.27,-0.77 1.27,-1.27 ; 1.27,0.77 1.27,1.27 ; 1.27,1.77 1.27,1.27 ; 1.77,-1.27 1.27,-1.27 ; 1.77,1.27 1.27,1.27
Mechanical 14:
  circle w0.3: c-7.262,-1.397 r0.15
  lines w0.1: -8.11,-1.45 -10.17,-1.45 cw(c-10.17,0) -10.17,1.45 -8.11,1.45 ; -3.956,-0.635 -3.956,-0.254 ; -3.956,0.635 -3.956,0.254 ; -4.464,-0.254 -3.448,-0.254 ; -4.464,-0.254 -3.956,0.254 ; -4.464,-0.254 -3.956,0.254 ; -4.464,-0.254 -3.448,-0.254 ; -4.464,-0.254 -3.448,-0.254 ; -4.464,-0.254 -3.956,0.254 ; -4.464,0.254 -3.448,0.254 ; -4.464,0.254 -3.448,0.254 ; -4.464,0.254 -3.448,0.254 ; -3.956,0.254 -3.448,-0.254 ; -3.956,0.254 -3.448,-0.254 ; -3.956,0.254 -3.448,-0.254 ; -8.11,-2.16 -8.11,2.16 2.44,2.16 2.44,-2.16 -8.11,-2.16
  text "A" at -2.051,-0.381 h1
  text "B" at 0.489,-0.381 h1
3D body "LED_DIALIGHT_553-0133-200F.stp": height 9.65, standoff -3.68, extent -11.62,-2.16 2.44,2.16

## LED_DIALIGHT_553-0188F [mm] "Dual 3mm Blue LED, Body 8.1x4.3mm, Pin spacing 2.54mm"
height 9.65
pads (4):
  round 1.6 hole 0.9: 1(-1.27,-1.27) 2(-1.27,1.27) 3(1.27,-1.27) 4(1.27,1.27)
Top Overlay:
  circle w0.3: c-5.037,-1.272 r0.15
  lines w0.2: -5.715,-1.86 -2.2,-1.86 ; -5.715,-1.45 -7.475,-1.45 cw(c-7.475,0) -7.475,1.45 -5.715,1.45 ; -4.572,-0.254 -3.556,-0.254 ; -4.064,-0.635 -4.064,-0.254 ; -4.064,0.254 -4.064,0.635 ; -2.2,2.16 -5.715,2.16 -5.715,-2.16 -2,-2.16 ; -0.5,-2.16 0.5,-2.16 ; -0.3,-1.86 0.3,-1.86 ; -0.3,2.16 0.3,2.16 ; 2,2.16 2.413,2.16 2.413,-2.16 2.1,-2.16 ; -4.064,-0.254 -3.556,0.254 -4.572,0.254 -4.064,-0.254
  text "A" at -2.1,-0.381 h1
  text "B" at 0.7,-0.3 h1
Notvisible:
  lines w0.1: -1.77,-1.27 -1.27,-1.27 ; -1.77,1.27 -1.27,1.27 ; -1.27,-1.77 -1.27,-1.27 ; -1.27,-0.77 -1.27,-1.27 ; -1.27,0.77 -1.27,1.27 ; -1.27,1.77 -1.27,1.27 ; -0.77,-1.27 -1.27,-1.27 ; -0.77,1.27 -1.27,1.27 ; -0.5,0 0,0 ; 0,-0.5 0,0 ; 0,0.5 0,0 ; 0.5,0 0,0 ; 0.77,-1.27 1.27,-1.27 ; 0.77,1.27 1.27,1.27 ; 1.27,-1.77 1.27,-1.27 ; 1.27,-0.77 1.27,-1.27 ; 1.27,0.77 1.27,1.27 ; 1.27,1.77 1.27,1.27 ; 1.77,-1.27 1.27,-1.27 ; 1.77,1.27 1.27,1.27
Mechanical 14:
  circle w0.3: c-5.037,-1.272 r0.15
  lines w0.1: -5.715,-1.86 2.413,-1.86 ; -5.715,-1.45 -7.475,-1.45 cw(c-7.475,0) -7.475,1.45 -5.715,1.45 ; -4.064,-0.635 -4.064,-0.254 ; -4.064,0.254 -4.064,0.635 ; -4.572,-0.254 -3.556,-0.254 ; -4.572,-0.254 -3.556,-0.254 ; -4.572,-0.254 -3.556,-0.254 ; -4.572,0.254 -3.556,0.254 ; -4.572,0.254 -4.064,-0.254 ; -4.572,0.254 -4.064,-0.254 ; -4.572,0.254 -3.556,0.254 ; -4.572,0.254 -3.556,0.254 ; -4.572,0.254 -4.064,-0.254 ; -4.064,-0.254 -3.556,0.254 ; -4.064,-0.254 -3.556,0.254 ; -4.064,-0.254 -3.556,0.254 ; -5.715,-2.16 2.413,-2.16 2.413,2.16 -5.715,2.16 -5.715,-2.16
  text "A" at -2.1,-0.381 h1
  text "B" at 0.7,-0.3 h1
3D body "LED_DIALIGHT_553-0188F.stp": height 9.65, standoff -3.68, extent -8.925,-2.16 2.413,2.16

## LED_DIALIGHT_553-0222-210F [mm] "Dual 3mm Green LED, Body 10.55x4.32mm, Pin spacing 2.54mm"
height 9.65
pads (4):
  round 1.6 hole 0.9: 1(-1.27,1.27) 2(-1.27,-1.27) 3(1.27,1.27) 4(1.27,-1.27)
Top Overlay:
  circle w0.3: c-7.347,1.312 r0.15
  lines w0.2: -8.11,-1.45 -10.17,-1.45 cw(c-10.17,0) -10.17,1.45 -8.11,1.45 ; -4.508,-0.258 -3.492,-0.258 ; -4,-0.639 -4,-0.258 ; -4,0.25 -4,0.631 ; -2.075,-2.16 -8.11,-2.16 -8.11,2.16 -2.075,2.16 ; -0.465,-2.16 0.465,-2.16 ; -0.465,2.16 0.465,2.16 ; 2.075,-2.16 2.44,-2.16 2.44,2.16 2.075,2.16 ; -4,-0.258 -4.508,0.25 -3.492,0.25 -4,-0.258
  text "B" at 0.489,-0.381 h1
  text "A" at -2.051,-0.381 h1
Notvisible:
  lines w0.1: -1.77,-1.27 -1.27,-1.27 ; -1.77,1.27 -1.27,1.27 ; -1.27,-1.77 -1.27,-1.27 ; -1.27,-0.77 -1.27,-1.27 ; -1.27,0.77 -1.27,1.27 ; -1.27,1.77 -1.27,1.27 ; -0.77,-1.27 -1.27,-1.27 ; -0.77,1.27 -1.27,1.27 ; -0.5,0 0,0 ; 0,-0.5 0,0 ; 0,0.5 0,0 ; 0.5,0 0,0 ; 0.77,-1.27 1.27,-1.27 ; 0.77,1.27 1.27,1.27 ; 1.27,-1.77 1.27,-1.27 ; 1.27,-0.77 1.27,-1.27 ; 1.27,0.77 1.27,1.27 ; 1.27,1.77 1.27,1.27 ; 1.77,-1.27 1.27,-1.27 ; 1.77,1.27 1.27,1.27
Mechanical 14:
  circle w0.3: c-7.347,1.312 r0.15
  lines w0.1: -8.11,-1.45 -10.17,-1.45 cw(c-10.17,0) -10.17,1.45 -8.11,1.45 ; -4,-0.639 -4,-0.258 ; -4,0.25 -4,0.631 ; -4.508,-0.258 -3.492,-0.258 ; -4.508,-0.258 -3.492,-0.258 ; -4.508,-0.258 -3.492,-0.258 ; -4.508,0.25 -4,-0.258 ; -4.508,0.25 -3.492,0.25 ; -4.508,0.25 -3.492,0.25 ; -4.508,0.25 -4,-0.258 ; -4.508,0.25 -4,-0.258 ; -4.508,0.25 -3.492,0.25 ; -4,-0.258 -3.492,0.25 ; -4,-0.258 -3.492,0.25 ; -4,-0.258 -3.492,0.25 ; -8.11,-2.16 2.44,-2.16 2.44,2.16 -8.11,2.16 -8.11,-2.16
  text "B" at 0.489,-0.381 h1
  text "A" at -2.051,-0.381 h1
3D body "LED_DIALIGHT_553-0222-210F.stp": height 9.65, standoff -3.68, extent -11.62,-2.16 2.44,2.16

## LED_DIALIGHT_553-0222F [mm] "Dual 3mm Green LED, Body 8.1x4.3mm, Pin spacing 2.54mm"
height 9.65
pads (4):
  round 1.6 hole 0.9: 1(-1.27,-1.27) 2(-1.27,1.27) 3(1.27,-1.27) 4(1.27,1.27)
Top Overlay:
  circle w0.3: c-5.037,-1.272 r0.15
  lines w0.2: -5.715,-1.86 -2.2,-1.86 ; -5.715,-1.45 -7.475,-1.45 cw(c-7.475,0) -7.475,1.45 -5.715,1.45 ; -4.572,-0.254 -3.556,-0.254 ; -4.064,-0.635 -4.064,-0.254 ; -4.064,0.254 -4.064,0.635 ; -2.2,2.16 -5.715,2.16 -5.715,-2.16 -2,-2.16 ; -0.5,-2.16 0.5,-2.16 ; -0.3,-1.86 0.3,-1.86 ; -0.3,2.16 0.3,2.16 ; 2,2.16 2.413,2.16 2.413,-2.16 2.1,-2.16 ; -4.064,-0.254 -4.572,0.254 -3.556,0.254 -4.064,-0.254
  text "B" at 0.7,-0.3 h1
  text "A" at -2.1,-0.381 h1
Notvisible:
  lines w0.1: -1.77,-1.27 -1.27,-1.27 ; -1.77,1.27 -1.27,1.27 ; -1.27,-1.77 -1.27,-1.27 ; -1.27,-0.77 -1.27,-1.27 ; -1.27,0.77 -1.27,1.27 ; -1.27,1.77 -1.27,1.27 ; -0.77,-1.27 -1.27,-1.27 ; -0.77,1.27 -1.27,1.27 ; -0.5,0 0,0 ; 0,-0.5 0,0 ; 0,0.5 0,0 ; 0.5,0 0,0 ; 0.77,-1.27 1.27,-1.27 ; 0.77,1.27 1.27,1.27 ; 1.27,-1.77 1.27,-1.27 ; 1.27,-0.77 1.27,-1.27 ; 1.27,0.77 1.27,1.27 ; 1.27,1.77 1.27,1.27 ; 1.77,-1.27 1.27,-1.27 ; 1.77,1.27 1.27,1.27
Mechanical 14:
  circle w0.3: c-5.037,-1.272 r0.15
  lines w0.1: -5.715,-1.86 2.413,-1.86 ; -5.715,-1.45 -7.475,-1.45 cw(c-7.475,0) -7.475,1.45 -5.715,1.45 ; -4.064,-0.635 -4.064,-0.254 ; -4.064,0.254 -4.064,0.635 ; -4.572,-0.254 -3.556,-0.254 ; -4.572,-0.254 -3.556,-0.254 ; -4.572,-0.254 -3.556,-0.254 ; -4.572,0.254 -4.064,-0.254 ; -4.572,0.254 -3.556,0.254 ; -4.572,0.254 -3.556,0.254 ; -4.572,0.254 -4.064,-0.254 ; -4.572,0.254 -4.064,-0.254 ; -4.572,0.254 -3.556,0.254 ; -4.064,-0.254 -3.556,0.254 ; -4.064,-0.254 -3.556,0.254 ; -4.064,-0.254 -3.556,0.254 ; -5.715,-2.16 -5.715,2.16 2.413,2.16 2.413,-2.16 -5.715,-2.16
  text "B" at 0.7,-0.3 h1
  text "A" at -2.1,-0.381 h1
3D body "LED_DIALIGHT_553-0222F.stp": height 9.65, standoff -3.68, extent -8.925,-2.16 2.413,2.16

## LED_DIALIGHT_553-0233-210F [mm] "Dual 3mm Yellow LED, Body 10.55x4.32mm, Pin spacing 2.54mm"
height 9.65
pads (4):
  round 1.6 hole 0.9: 1(-1.27,1.27) 2(-1.27,-1.27) 3(1.27,1.27) 4(1.27,-1.27)
Top Overlay:
  circle w0.3: c-7.347,1.312 r0.15
  lines w0.2: -8.11,-1.45 -10.17,-1.45 cw(c-10.17,0) -10.17,1.45 -8.11,1.45 ; -4.508,-0.258 -3.492,-0.258 ; -4,-0.639 -4,-0.258 ; -4,0.25 -4,0.631 ; -2.075,-2.16 -8.11,-2.16 -8.11,2.16 -2.075,2.16 ; -0.465,-2.16 0.465,-2.16 ; -0.465,2.16 0.465,2.16 ; 2.075,-2.16 2.44,-2.16 2.44,2.16 2.075,2.16 ; -4,-0.258 -3.492,0.25 -4.508,0.25 -4,-0.258
  text "A" at -2.051,-0.381 h1
  text "B" at 0.489,-0.381 h1
Notvisible:
  lines w0.1: -1.77,-1.27 -1.27,-1.27 ; -1.77,1.27 -1.27,1.27 ; -1.27,-1.77 -1.27,-1.27 ; -1.27,-0.77 -1.27,-1.27 ; -1.27,0.77 -1.27,1.27 ; -1.27,1.77 -1.27,1.27 ; -0.77,-1.27 -1.27,-1.27 ; -0.77,1.27 -1.27,1.27 ; -0.5,0 0,0 ; 0,-0.5 0,0 ; 0,0.5 0,0 ; 0.5,0 0,0 ; 0.77,-1.27 1.27,-1.27 ; 0.77,1.27 1.27,1.27 ; 1.27,-1.77 1.27,-1.27 ; 1.27,-0.77 1.27,-1.27 ; 1.27,0.77 1.27,1.27 ; 1.27,1.77 1.27,1.27 ; 1.77,-1.27 1.27,-1.27 ; 1.77,1.27 1.27,1.27
Mechanical 14:
  circle w0.3: c-7.347,1.312 r0.15
  lines w0.1: -8.11,-1.45 -10.17,-1.45 cw(c-10.17,0) -10.17,1.45 -8.11,1.45 ; -4,-0.639 -4,-0.258 ; -4,0.25 -4,0.631 ; -4.508,-0.258 -3.492,-0.258 ; -4.508,-0.258 -3.492,-0.258 ; -4.508,-0.258 -3.492,-0.258 ; -4.508,0.25 -3.492,0.25 ; -4.508,0.25 -4,-0.258 ; -4.508,0.25 -4,-0.258 ; -4.508,0.25 -3.492,0.25 ; -4.508,0.25 -3.492,0.25 ; -4.508,0.25 -4,-0.258 ; -4,-0.258 -3.492,0.25 ; -4,-0.258 -3.492,0.25 ; -4,-0.258 -3.492,0.25 ; -8.11,-2.16 -8.11,2.16 2.44,2.16 2.44,-2.16 -8.11,-2.16
  text "A" at -2.051,-0.381 h1
  text "B" at 0.489,-0.381 h1
3D body "LED_DIALIGHT_553-0233-210F.stp": height 9.65, standoff -3.68, extent -11.62,-2.16 2.44,2.16